# Altium footprint library PcbLib.PcbLib: 154 footprints (part 2 of 10)
Each footprint in its own frame and in the unit in brackets; x right, y up, seen from the top. Pads: shape width x height; smd on the part's side, far side on the other; paste and mask are expansions set on the pad; w line width, h text height; cw(c..) or ccw(c..) is an arc to the next point about the centre after c.
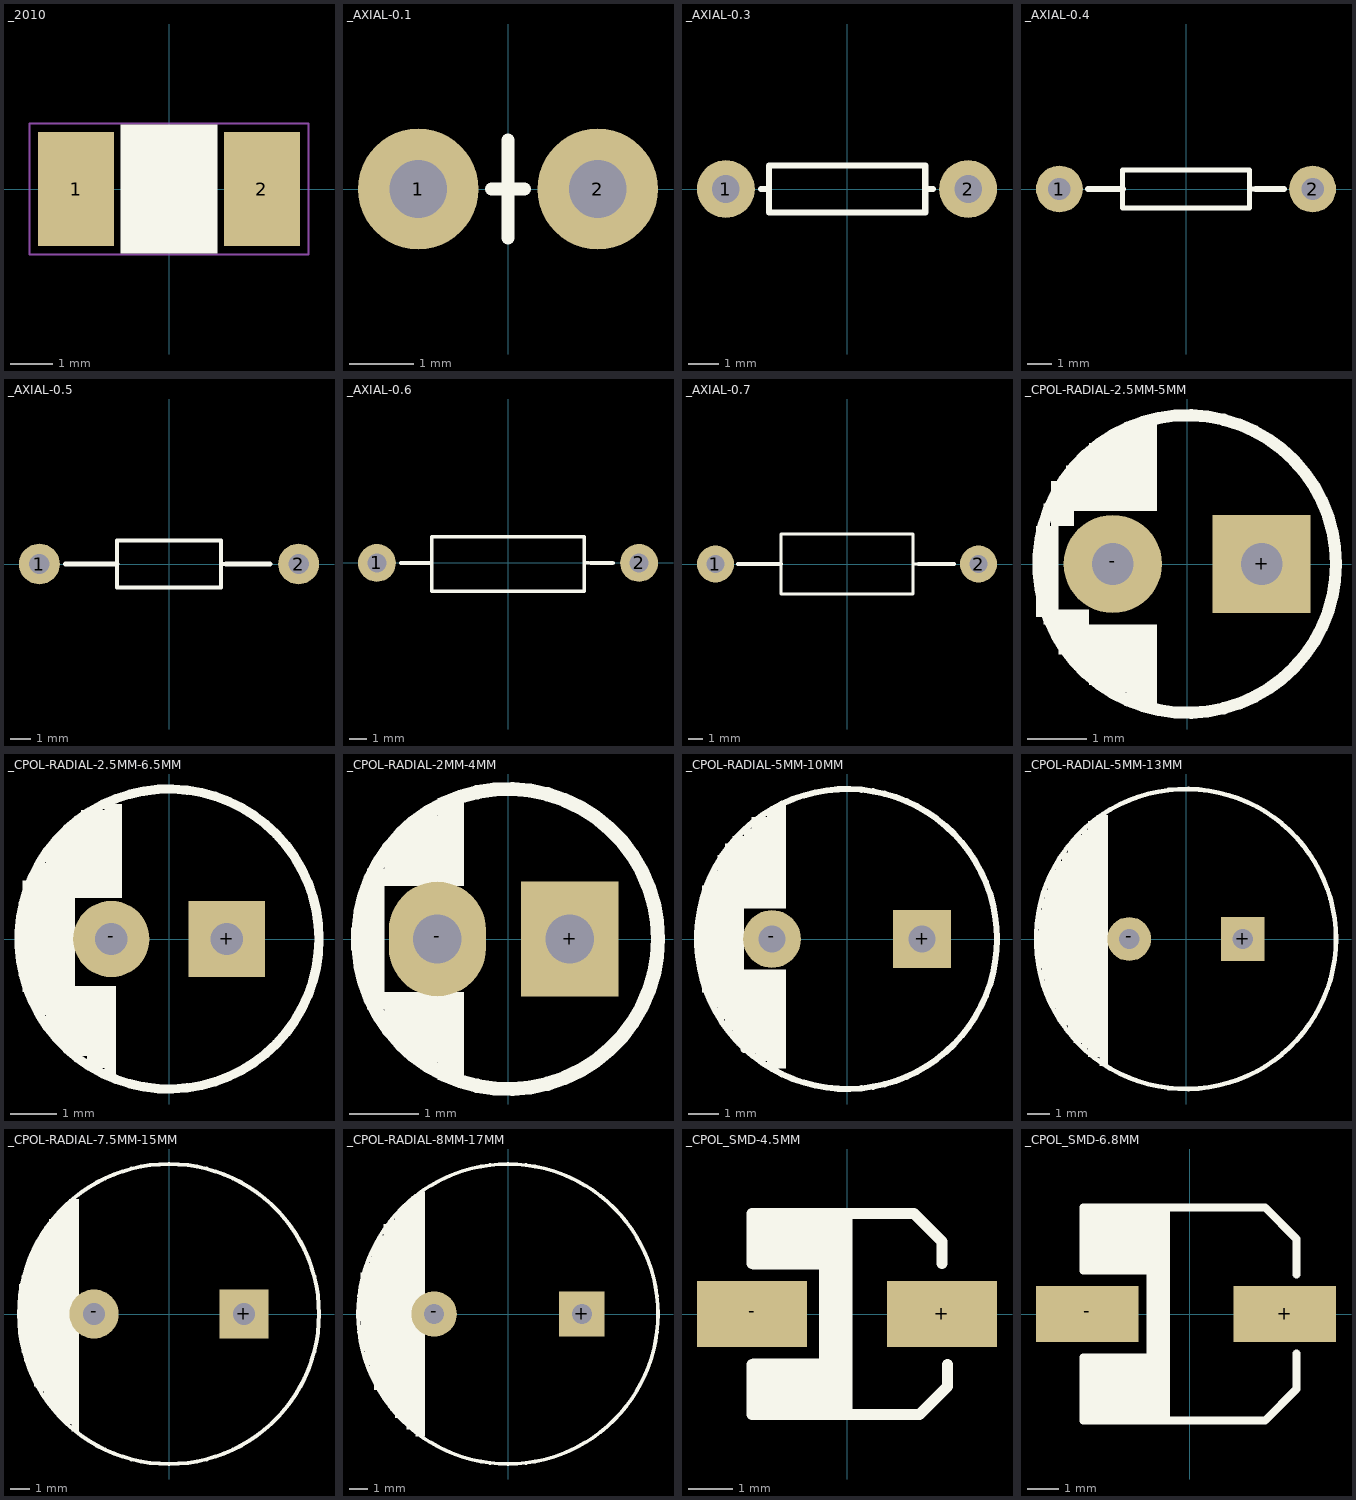
[diagram p1: the footprints below, top view; thin cyan lines are the x and y axes]

## _2010 [mm]
pads (2):
  rect 1.8x2.7 smd: 1(-2.2,0) 2(2.2,0)
Top Overlay:
  rectangle: -1.143,-1.524 1.143,1.524
Mechanical 16:
  rectangle: 1.651,-1.25 2.5,1.25
  rectangle: -2.5,-1.25 -1.639,1.25
Mechanical 27:
  lines w0.051: -3.3,-1.55 -3.3,1.55 3.3,1.55 3.3,-1.55 -3.3,-1.55

## _AXIAL-0.1 [mil]
pads (2):
  round 74 hole 35.43: 1(-55,0) 2(55,0)
Top Overlay:
  lines w8: -10,0 0,0 ; 0,-30 0,0 ; 0,30 0,0 ; 10,0 0,0

## _AXIAL-0.3 [mil]
pads (2):
  round 74 hole 35.43: 1(-155,0) 2(155,0)
Top Overlay:
  lines w8: -110,0 -100,0 ; 110,0 100,0 ; -100,0 -100,30 100,30 100,0 ; -100,0 -100,-30 100,-30 100,0

## _AXIAL-0.4 [mil]
pads (2):
  round 74 hole 35.43: 1(-200,0) 2(200,0)
Top Overlay:
  lines w8: -100,-5 -100,30 100,30 100,0 ; -100,0 -100,-30 100,-30 100,0 ; 110,0 100,0
  lines w9.84: -155,0 -100,0 ; 110,0 155,0

## _AXIAL-0.5 [mm]
pads (2):
  round 2 hole 1: 1(-6.35,0) 2(6.35,0)
Top Overlay:
  lines w0.203: -2.54,-0.127 -2.54,1.143 2.54,1.143 2.54,0 ; -2.54,0 -2.54,-1.143 2.54,-1.143 2.54,0 ; 2.794,0 2.54,0
  lines w0.25: -5.08,0 -2.54,0 ; 2.794,0 4.953,0

## _AXIAL-0.6 [mm]
pads (2):
  round 2.2 hole 1.1: 1(-7.62,0) 2(7.62,0)
Top Overlay:
  lines w0.203: -4.445,-0.127 -4.445,1.524 4.445,1.524 4.445,0 ; -4.445,0 -4.445,-1.651 4.445,-1.651 4.445,0 ; 4.699,0 4.445,0
  lines w0.25: -6.223,0 -4.445,0 ; 4.826,0 6.096,0

## _AXIAL-0.7 [mm]
pads (2):
  round 2.5 hole 1.2: 1(-8.89,0) 2(8.89,0)
Top Overlay:
  lines w0.203: -4.445,-0.127 -4.445,2.032 4.445,2.032 4.445,0 ; -4.445,0 -4.445,-2.032 4.445,-2.032 4.445,0 ; 4.699,0 4.445,0
  lines w0.25: -7.366,0 -4.445,0 ; 4.826,0 7.239,0

## _CPOL-RADIAL-2.5MM-5MM [mil]
pads (2):
  rect 65x65 hole 27.56: +(49.21,0)
  round 65 hole 27.56: -(-49.21,0)
Top Overlay:
  circle w8: c0,0 r98.43
  rectangle: -95,-40 -65,-30
  rectangle: -100,-35 -85,25
  rectangle: -90,25 -75,35
  rectangle: -85,-60 -70,-50
  rectangle: -85,-50 -75,-35
  rectangle: -75,-70 -65,-35
  rectangle: -65,-80 -20,-40
  rectangle: -90,45 -80,55
  rectangle: -80,40 -70,45
  rectangle: -90,35 -80,45
  rectangle: -90,40 -80,45
  rectangle: -80,35 -55,65
  rectangle: -70,35 -20,70
  rectangle: -35,70 -20,95
  rectangle: -65,70 -35,80
  rectangle: -50,70 -35,85
  rectangle: -35,-95 -20,-80
  rectangle: -55,-85 -25,-70
  rectangle: -40,-90 -25,-85
  rectangle: -95,35 -80,40
  rectangle: -80,55 -70,60
  rectangle: -70,60 -65,70
  rectangle: -45,80 -25,90

## _CPOL-RADIAL-2.5MM-6.5MM [mil]
pads (2):
  rect 65x65 hole 27.56: +(49.21,0)
  round 65 hole 27.56: -(-49.21,0)
Top Overlay:
  circle w8: c0,0 r127.95
  rectangle: -55,110 -40,115
  rectangle: -75,90 -40,110
  rectangle: -95,-10 -80,35
  rectangle: -95,10 -85,35
  rectangle: -95,-55 -80,-10
  rectangle: -55,-120 -45,-110
  rectangle: -70,-110 -45,-100
  rectangle: -70,-100 -45,-90
  rectangle: -95,-90 -45,-40
  rectangle: -95,35 -40,90
  rectangle: -125,-45 -110,50
  rectangle: -115,-65 -100,65
  rectangle: -105,-80 -90,80
  rectangle: -85,-100 -70,-85
  rectangle: -85,55 -65,100

## _CPOL-RADIAL-2MM-4MM [mil]
pads (2):
  rect 55.12x65 hole 27.56: +(35,0)
  oval 55.12x65 hole 27.56: -(-40,0)
Top Overlay:
  circle w8: c0,0 r85
  rectangle: -70,-40 -25,-30
  rectangle: -70,30 -25,40
  rectangle: -80,30 -70,40
  rectangle: -85,-5 -70,15
  rectangle: -80,-40 -70,30
  rectangle: -70,30 -55,40
  rectangle: -60,55 -50,65
  rectangle: -50,55 -40,70
  rectangle: -70,40 -40,55
  rectangle: -60,-65 -50,-45
  rectangle: -55,-70 -35,-55
  rectangle: -85,-25 -75,5
  rectangle: -70,-55 -40,-35
  rectangle: -40,-80 -25,-40
  rectangle: -40,40 -25,80

## _CPOL-RADIAL-5MM-10MM [mil]
pads (2):
  rect 76x76 hole 35.43: +(98.43,0)
  round 76 hole 35.43: -(-98.43,0)
Top Overlay:
  circle w8: c0,0 r196.85
  rectangle: -150,-130 -135,135
  rectangle: -160,-120 -145,125
  rectangle: -170,-105 -160,110
  rectangle: -180,-90 -170,90
  rectangle: -190,-70 -180,70
  rectangle: -195,-35 -190,35
  rectangle: -135,40 -80,145
  rectangle: -90,145 -80,175
  rectangle: -105,145 -90,170
  rectangle: -125,145 -105,160
  rectangle: -135,-110 -80,-40
  rectangle: -145,-140 -80,-110
  rectangle: -120,-155 -80,-140
  rectangle: -115,-160 -80,-155
  rectangle: -105,-170 -80,-160
  lines w9.84: -120,-145 -135,-145 -120,-130

## _CPOL-RADIAL-5MM-13MM [mil]
pads (2):
  rect 76x76 hole 35.43: +(98.43,0)
  round 76 hole 35.43: -(-98.43,0)
Top Overlay:
  circle w8: c0,0 r260.05
  rectangle: -200,160 -190,170
  rectangle: -200,-170 -190,-160
  rectangle: -220,-140 -210,-120
  rectangle: -255,-50 -245,50
  rectangle: -250,-70 -230,70
  rectangle: -245,-90 -230,85
  rectangle: -240,-110 -230,100
  rectangle: -235,-120 -220,120
  rectangle: -225,-130 -215,135
  rectangle: -215,-150 -200,150
  rectangle: -205,-160 -190,160
  rectangle: -195,-180 -190,175
  rectangle: -190,-180 -175,180
  rectangle: -180,-190 -170,190
  rectangle: -170,-205 -150,205
  rectangle: -150,-220 -135,15
  rectangle: -155,15 -135,215
  rectangle: -260,-25 -135,15

## _CPOL-RADIAL-7.5MM-15MM [mm]
pads (2):
  rect 2.5x2.5 hole 1.1: +(3.81,0)
  round 2.5 hole 1.1: -(-3.81,0)
Top Overlay:
  circle w0.203: c0,0 r7.621
  rectangle: -4.953,-5.969 -4.826,-5.207
  rectangle: -5.207,-5.588 -4.699,-5.461
  rectangle: -5.461,-5.461 -4.572,-5.08
  rectangle: -5.715,-5.207 -4.699,-4.953
  rectangle: -6.223,-4.572 -5.842,-4.064
  rectangle: -5.969,-4.826 -5.588,-4.064
  rectangle: -6.35,-4.318 -5.588,-3.683
  rectangle: -6.858,-3.683 -6.35,-3.429
  rectangle: -7.366,-2.413 -6.985,-2.032
  rectangle: -7.112,-3.048 -6.858,-1.778
  rectangle: -6.858,-3.429 -6.604,-1.905
  rectangle: -5.842,-4.953 -4.826,-3.81
  rectangle: -6.604,-3.937 -4.699,-1.905
  rectangle: -7.366,-2.032 -4.699,-1.651
  rectangle: -7.493,-1.651 -4.699,-0.635
  rectangle: -4.826,-5.969 -4.572,1.016
  rectangle: -5.842,4.826 -5.715,4.953
  rectangle: -5.08,5.588 -4.572,5.842
  rectangle: -5.334,5.334 -4.572,5.588
  rectangle: -5.461,5.08 -4.572,5.334
  rectangle: -5.588,5.08 -4.826,5.207
  rectangle: -5.715,4.826 -4.572,5.08
  rectangle: -6.096,4.445 -4.572,4.826
  rectangle: -6.35,3.81 -4.572,4.445
  rectangle: -6.477,3.81 -4.953,4.064
  rectangle: -6.731,3.429 -4.572,3.81
  rectangle: -6.858,3.048 -4.572,3.429
  rectangle: -7.112,2.54 -4.572,3.048
  rectangle: -7.239,2.032 -4.572,2.54
  rectangle: -7.366,1.524 -4.572,2.032
  rectangle: -7.62,0.762 -4.572,1.524
  rectangle: -7.62,-0.635 -4.699,0.762

## _CPOL-RADIAL-8MM-17MM [mm]
pads (2):
  rect 2.5x2.5 hole 1.1: +(4.064,0)
  round 2.5 hole 1.1: -(-4.064,0)
Top Overlay:
  circle w0.203: c0,0 r8.256
  rectangle: -4.953,-5.969 -4.826,-5.207
  rectangle: -5.207,-5.588 -4.699,-5.461
  rectangle: -5.461,-5.461 -4.572,-5.08
  rectangle: -5.715,-5.207 -4.699,-4.953
  rectangle: -6.223,-4.572 -5.842,-4.064
  rectangle: -5.969,-4.826 -5.588,-4.064
  rectangle: -6.35,-4.318 -5.588,-3.683
  rectangle: -6.858,-3.683 -6.35,-3.429
  rectangle: -7.366,-2.413 -6.985,-2.032
  rectangle: -7.112,-3.048 -6.858,-1.778
  rectangle: -6.858,-3.429 -6.604,-1.905
  rectangle: -5.842,-4.953 -4.826,-3.81
  rectangle: -6.604,-3.937 -4.699,-1.905
  rectangle: -7.366,-2.032 -4.699,-1.651
  rectangle: -7.493,-1.651 -4.699,-0.635
  rectangle: -4.826,-5.969 -4.572,1.016
  rectangle: -5.842,4.826 -5.715,4.953
  rectangle: -5.08,5.588 -4.572,5.842
  rectangle: -5.334,5.334 -4.572,5.588
  rectangle: -5.461,5.08 -4.572,5.334
  rectangle: -5.588,5.08 -4.826,5.207
  rectangle: -5.715,4.826 -4.572,5.08
  rectangle: -6.096,4.445 -4.572,4.826
  rectangle: -6.35,3.81 -4.572,4.445
  rectangle: -6.477,3.81 -4.953,4.064
  rectangle: -6.731,3.429 -4.572,3.81
  rectangle: -6.858,3.048 -4.572,3.429
  rectangle: -7.112,2.54 -4.572,3.048
  rectangle: -7.239,2.032 -4.572,2.54
  rectangle: -7.366,1.524 -4.572,2.032
  rectangle: -7.62,0.762 -4.572,1.524
  rectangle: -7.62,-0.635 -4.699,0.762
  rectangle: -4.953,5.588 -4.572,6.731
  rectangle: -5.461,4.572 -5.08,6.35
  rectangle: -4.953,5.588 -4.826,6.477
  rectangle: -5.334,5.588 -4.953,6.477
  rectangle: -5.715,5.08 -5.334,6.096
  rectangle: -5.969,4.699 -5.461,5.842
  rectangle: -6.223,4.064 -5.842,5.588
  rectangle: -6.477,3.81 -6.096,5.207
  rectangle: -6.858,3.429 -6.35,4.953
  rectangle: -7.112,2.667 -6.858,4.318
  rectangle: -7.239,2.54 -7.112,4.064
  rectangle: -7.366,1.905 -7.239,3.81
  rectangle: -7.493,1.524 -7.366,3.556
  rectangle: -7.62,1.524 -7.493,3.175
  rectangle: -7.874,-2.413 -7.366,2.413
  rectangle: -7.62,-3.429 -6.858,-2.286
  rectangle: -7.366,-3.683 -6.731,-3.429
  rectangle: -7.366,-3.937 -6.604,-3.683
  rectangle: -7.366,-4.191 -6.096,-3.937
  rectangle: -6.985,-4.572 -5.842,-4.064
  rectangle: -6.731,-4.953 -5.842,-4.572
  rectangle: -6.477,-5.334 -5.461,-4.953
  rectangle: -6.223,-5.715 -5.08,-5.334
  rectangle: -5.842,-5.969 -4.826,-5.588
  rectangle: -4.826,-6.731 -4.572,-5.969
  rectangle: -5.08,-6.731 -4.826,-5.715
  rectangle: -5.588,-6.35 -5.207,-5.715
  rectangle: -5.588,-6.35 -4.953,-5.715
  rectangle: -7.874,-2.794 -7.62,-2.413
  rectangle: -8.128,-2.032 -7.874,2.286
  rectangle: -7.874,2.413 -7.493,2.794
  rectangle: -8.255,-0.381 -8.001,0.762

## _CPOL_SMD-4.5MM [mm]
pads (2):
  rect 2.5x1.5 smd: +(2.159,0) -(-2.159,0)
Top Overlay:
  rectangle: -2.159,1.016 -0.635,2.286
  rectangle: -2.159,-2.286 -0.635,-1.016
  rectangle: -0.635,-2.286 0.127,2.286
  lines w0.25: -2.159,-1.143 -2.159,-2.286 0.127,-2.286 1.651,-2.286 2.286,-1.651 2.286,-1.143 ; -2.159,1.143 -2.159,2.286 -0.254,2.286 1.524,2.286 2.159,1.651 2.159,1.143

## _CPOL_SMD-6.8MM [mm]
pads (2):
  rect 3.3x1.8 smd: +(3.048,0) -(-3.302,0)
Top Overlay:
  rectangle: -1.397,-1.27 -0.635,2.159
  rectangle: -3.429,-3.429 -0.635,-1.27
  rectangle: -3.429,1.27 -0.635,3.302
  lines w0.25: -3.429,-1.397 -3.429,-3.429 2.413,-3.429 3.429,-2.413 3.429,-1.27 ; -3.429,1.397 -3.429,3.429 -1.397,3.429 2.413,3.429 ; -2.159,3.429 2.413,3.429 ; 3.429,1.27 3.429,2.413 2.413,3.429